# Altium footprint library Gate Driver Board.PcbLib: 123 footprints (part 5 of 8)
Each footprint in its own frame and in the unit in brackets; x right, y up, seen from the top. Pads: shape width x height; smd on the part's side, far side on the other; paste and mask are expansions set on the pad; w line width, h text height; cw(c..) or ccw(c..) is an arc to the next point about the centre after c.
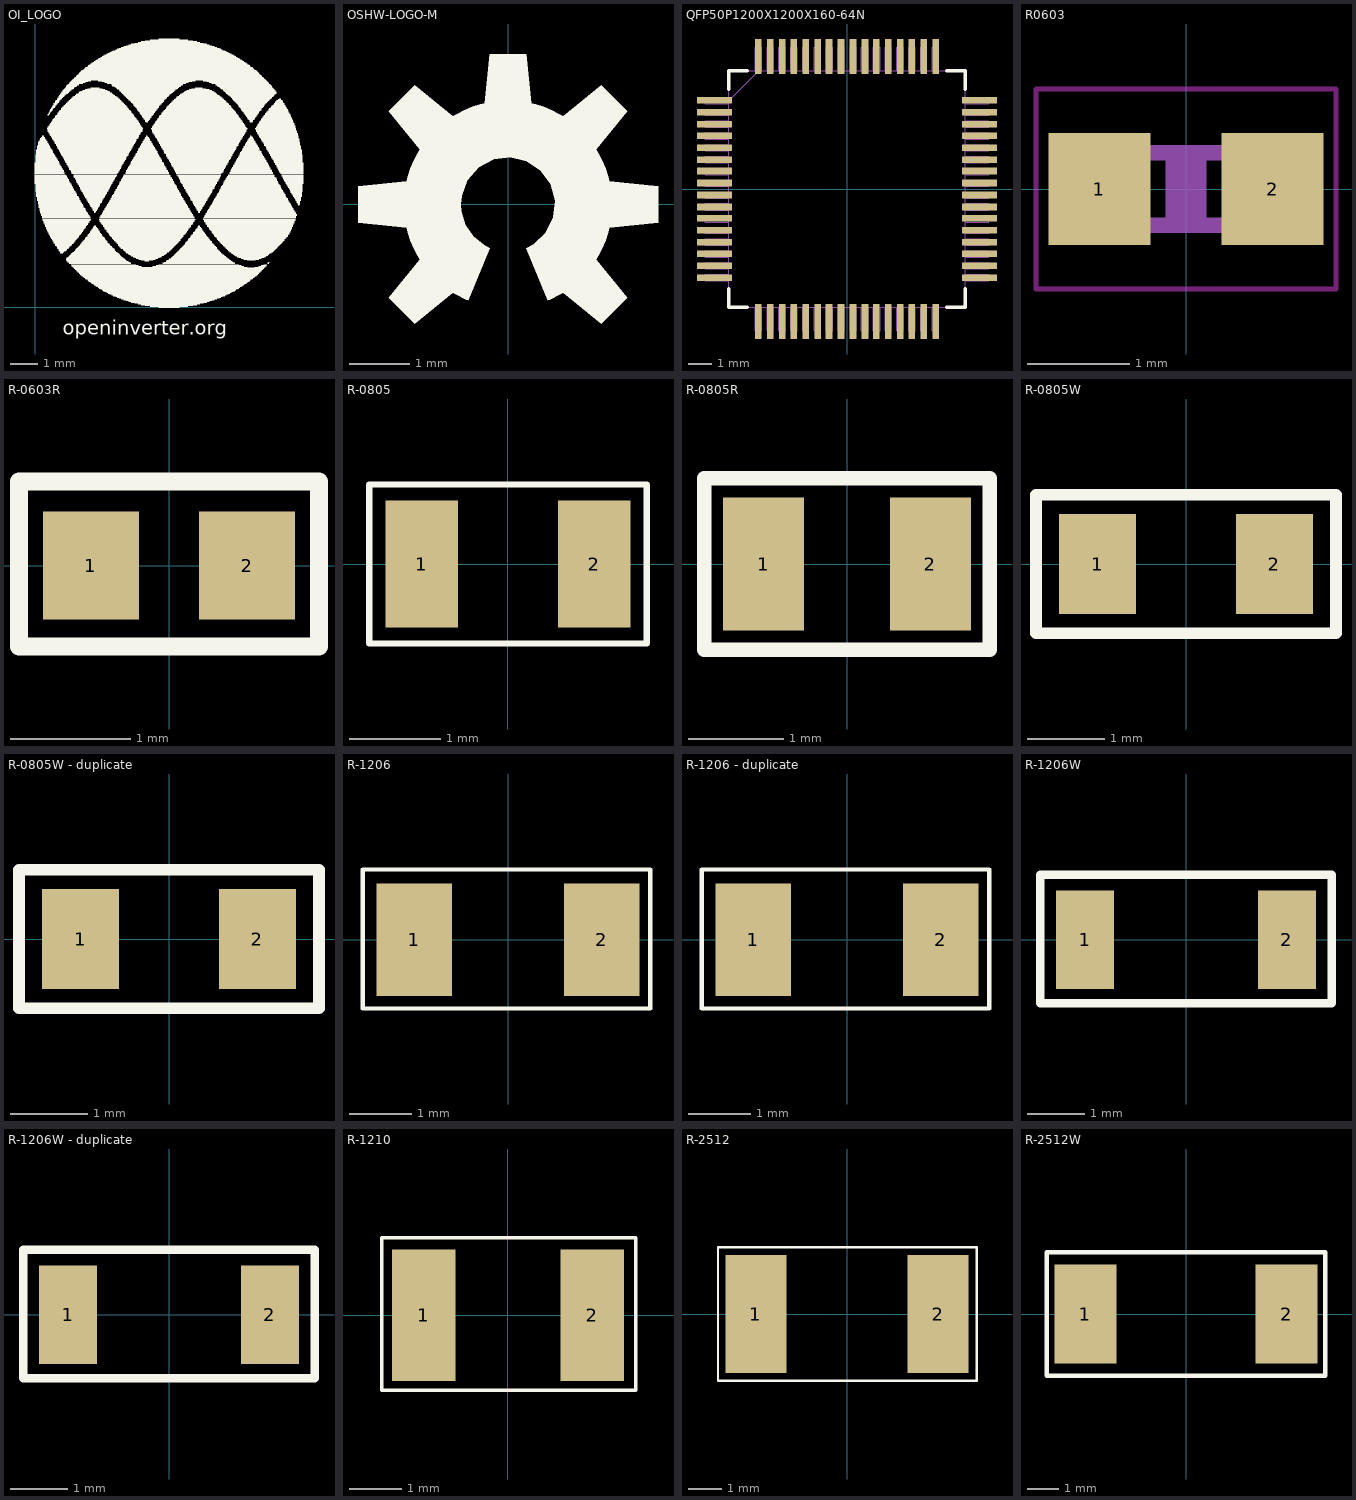
[diagram p4: the footprints below, top view; thin cyan lines are the x and y axes]

## OI_LOGO [mm] "OI_LOGO"
Top Overlay:
  drawing of 1208 lines, arcs and shapes, not listed
  text "openinverter.org" at 1,-1 h0.52

## OSHW-LOGO-M [mm] "OSHW-LOGO-M"
Top Overlay:
  region: 0.658,-1.588 0.691,-1.574 0.755,-1.544 0.819,-1.512 0.881,-1.477 0.911,-1.458 1.539,-1.97 1.97,-1.539 1.458,-0.911 1.495,-0.85 1.561,-0.724 1.615,-0.592 1.659,-0.456 1.675,-0.387 2.481,-0.305 2.481,0.305 1.675,0.387 1.659,0.456 1.615,0.592 1.561,0.724 1.495,0.85 1.458,0.911 1.97,1.539 1.539,1.97 0.911,1.458 0.85,1.495 0.724,1.561 0.592,1.615 0.456,1.659 0.387,1.675 0.305,2.481 -0.305,2.481 -0.387,1.675 -0.456,1.659 -0.592,1.615 -0.724,1.561 -0.85,1.495 -0.911,1.458 -1.539,1.97 -1.97,1.539 -1.458,0.911 -1.495,0.85 -1.561,0.724 -1.615,0.592 -1.659,0.456 -1.675,0.387 -2.481,0.305 -2.481,-0.305 -1.675,-0.387 -1.659,-0.456 -1.615,-0.592 -1.561,-0.724 -1.495,-0.85 -1.458,-0.911 -1.97,-1.539 -1.539,-1.97 -0.911,-1.458 -0.881,-1.477 -0.819,-1.512 -0.755,-1.544 -0.691,-1.574 -0.658,-1.588 -0.299,-0.722 -0.402,-0.67 -0.579,-0.525 -0.706,-0.334 -0.773,-0.115 -0.781,0 -0.769,0.14 -0.67,0.402 -0.486,0.612 -0.239,0.744 0.038,0.78 0.311,0.717 0.543,0.561 0.706,0.334 0.779,0.064 0.751,-0.215 0.628,-0.465 0.423,-0.657 0.299,-0.722

## QFP50P1200X1200X160-64N [mil]
pads (64):
  rect 58x11 smd: 1(-221,148) 2(-221,128) 3(-221,108) 4(-221,89) 5(-221,69) 6(-221,49) 7(-221,30) 8(-221,10) 9(-221,-10) 10(-221,-30) 11(-221,-49) 12(-221,-69) 13(-221,-89) 14(-221,-108) 15(-221,-128) 16(-221,-148) 33(221,-148) 34(221,-128) 35(221,-108) 36(221,-89) 37(221,-69) 38(221,-49) 39(221,-30) 40(221,-10) 41(221,10) 42(221,30) 43(221,49) 44(221,69) 45(221,89) 46(221,108) 47(221,128) 48(221,148)
  rect 11x58 smd: 17(-148,-221) 18(-128,-221) 19(-108,-221) 20(-89,-221) 21(-69,-221) 22(-49,-221) 23(-30,-221) 24(-10,-221) 25(10,-221) 26(30,-221) 27(49,-221) 28(69,-221) 29(89,-221) 30(108,-221) 31(128,-221) 32(148,-221) 49(148,221) 50(128,221) 51(108,221) 52(89,221) 53(69,221) 54(49,221) 55(30,221) 56(10,221) 57(-10,221) 58(-30,221) 59(-49,221) 60(-69,221) 61(-89,221) 62(-108,221) 63(-128,221) 64(-148,221)
Top Overlay:
  lines w6: -197,-166 -197,-197 -166,-197 ; -197,166 -197,197 -166,197 ; 166,-197 197,-197 197,-166 ; 166,197 197,197 197,166
Mechanical 13:
  drawing of 331 lines, arcs and shapes, not listed
3D body "STM32F103RBT6--3DModel-STEP-56544.STEP": height 63.54, standoff 0.55, extent -236.21,-236.22 236.23,236.22

## R0603 [mm] "R0603"
pads (2):
  rect 1x1.1 smd: 1(-0.85,0) 2(0.85,0)
Top Layer keep-out:
  lines w0.051: -1.473,-0.983 -1.473,0.983 1.473,0.983 1.473,-0.983 -1.473,-0.983
Assembly Bottom:
  region: -0.838,-0.432 -0.838,0.432 -0.432,0.432 -0.432,-0.432
  region: 0.432,-0.432 0.432,0.432 0.838,0.432 0.838,-0.432
  lines w0.152: -0.432,-0.356 0.432,-0.356 ; -0.432,0.356 0.432,0.356
Top Glue Points:
  region: -0.2,-0.4 -0.2,0.4 0.2,0.4 0.2,-0.4

## R-0603R [mm] "resistor 0603 reflow soldering"
pads (2):
  rect 0.8x0.9 smd: 1(-0.65,0) 2(0.65,0)
Top Overlay:
  lines w0.152: -1.25,-0.675 0.325,-0.675 1.25,-0.675 1.25,0.7 0.35,0.7 -1.25,0.7 -1.25,-0.675
3D body "res0603.stp": height 0.45, standoff 0, extent -0.8,-0.4 0.8,0.4

## R-0805 [mm]
pads (2):
  rect 0.8x1.4 smd: 1(-0.95,0) 2(0.95,0)
Top Overlay:
  lines w0.07: -1.525,-0.875 1.525,-0.875 1.525,0.875 -1.525,0.875 -1.525,-0.875
3D body "User Library-CR2012-0805.STEP": height 0.56, standoff -0.04, extent -1,-0.625 1,0.625

## R-0805R [mm] "resistor 0805 reflow soldering"
pads (2):
  rect 0.85x1.4 smd: 1(-0.875,0) 2(0.875,0)
Top Overlay:
  lines w0.152: -1.5,-0.9 0.6,-0.9 1.5,-0.9 1.5,0.9 0.55,0.9 -1.5,0.9 -1.5,-0.9
3D body "RES0805.stp": height 0.5, standoff 0, extent -1,-0.625 1,0.625

## R-0805W [mm] "resistor 0805 wave soldering"
pads (2):
  rect 1x1.3 smd: 1(-1.15,0) 2(1.15,0)
Top Overlay:
  lines w0.152: -1.95,-0.9 -0.9,-0.9 1.95,-0.9 1.95,0.9 -0.9,0.9 -1.95,0.9 -1.95,-0.9
3D body "RES0805.stp": height 0.5, standoff 0, extent -1,-0.625 1,0.625

## R-0805W - duplicate [mm] "resistor 0805 wave soldering"
pads (2):
  rect 1x1.3 smd: 1(-1.15,0) 2(1.15,0)
Top Overlay:
  lines w0.152: -1.95,-0.9 -1.95,0.9 -0.9,0.9 1.95,0.9 1.95,-0.9 -0.9,-0.9 -1.95,-0.9
3D body "RES0805.stp": height 0.5, standoff 0, extent -1,-0.625 1,0.625

## R-1206 [mm]
pads (2):
  rect 1.2x1.8 smd: 1(-1.5,0) 2(1.5,0)
Top Overlay:
  lines w0.07: -0.275,-1.1 2.275,-1.1 ; -0.275,-1.1 -2.325,-1.1 -2.325,0.625 -2.325,1.125 -1.175,1.125 1.125,1.125 2.275,1.125 2.275,-1.1 ; -0.275,-1.1 2.275,-1.1
3D body "User Library-CR3216-1206.step": height 0.56, standoff -0.04, extent -1.6,-0.775 1.6,0.825

## R-1206 - duplicate [mm]
pads (2):
  rect 1.2x1.8 smd: 1(-1.5,0) 2(1.5,0)
Top Overlay:
  lines w0.07: -0.275,-1.1 2.275,-1.1 ; -0.275,-1.1 -2.325,-1.1 -2.325,0.625 -2.325,1.125 -1.175,1.125 1.125,1.125 2.275,1.125 2.275,-1.1 ; -0.275,-1.1 2.275,-1.1
3D body "User Library-CR3216-1206.step": height 0.56, standoff -0.04, extent -1.6,-0.775 1.6,0.825

## R-1206W [mm] "resistor 1206 wave soldering"
pads (2):
  rect 1x1.7 smd: 1(-1.75,0) 2(1.75,0)
Top Overlay:
  lines w0.152: -2.525,-1.1 2.525,-1.1 2.525,1.125 1.605,1.125 -2.525,1.125 -2.525,-1.1
3D body "RES1206.stp": height 0.55, standoff 0, extent -1.55,-0.775 1.55,0.777

## R-1206W - duplicate [mm] "resistor 1206 wave soldering"
pads (2):
  rect 1x1.7 smd: 1(-1.75,0) 2(1.75,0)
Top Overlay:
  lines w0.152: -2.525,-1.1 -2.525,1.125 1.605,1.125 2.525,1.125 2.525,-1.1 -2.525,-1.1
3D body "RES1206.stp": height 0.55, standoff 0, extent -1.55,-0.775 1.55,0.777

## R-1210 [mm]
pads (2):
  rect 1.2x2.5 smd: 1(-1.6,0) 2(1.6,0)
Top Overlay:
  lines w0.07: -2.4,-1.425 -1.512,-1.425 -0.038,-1.425 2.425,-1.425 2.425,1.475 -2.4,1.475 -2.4,0.9 -2.4,-1.425

## R-2512 [mm]
pads (2):
  rect 1.8x3.5 smd: 1(-2.7,0) 2(2.7,0)
Top Overlay:
  lines w0.07: -3.825,-1.975 -3.825,0.525 -3.825,1.975 3.85,1.975 3.85,-1.975 -3.825,-1.975
3D body "User Library-R SMD 2512.STEP": height 0.59, standoff -0.01, extent -3.206,-1.575 3.094,1.575

## R-2512W [mm] "resistor 2512 wave soldering"
pads (2):
  rect 2x3.2 smd: 1(-3.25,0) 2(3.25,0)
Top Overlay:
  lines w0.152: -4.5,-2 2.15,-2 4.5,-2 4.5,2 2.15,2 -4.5,2 -4.5,-2
3D body "res2512.stp": height 0.55, standoff 0, extent -3.15,-1.55 3.15,1.55